# Altium footprint library USER_Lib.PcbLib: 105 footprints (part 6 of 7)
Each footprint in its own frame and in the unit in brackets; x right, y up, seen from the top. Pads: shape width x height; smd on the part's side, far side on the other; paste and mask are expansions set on the pad; w line width, h text height; cw(c..) or ccw(c..) is an arc to the next point about the centre after c.
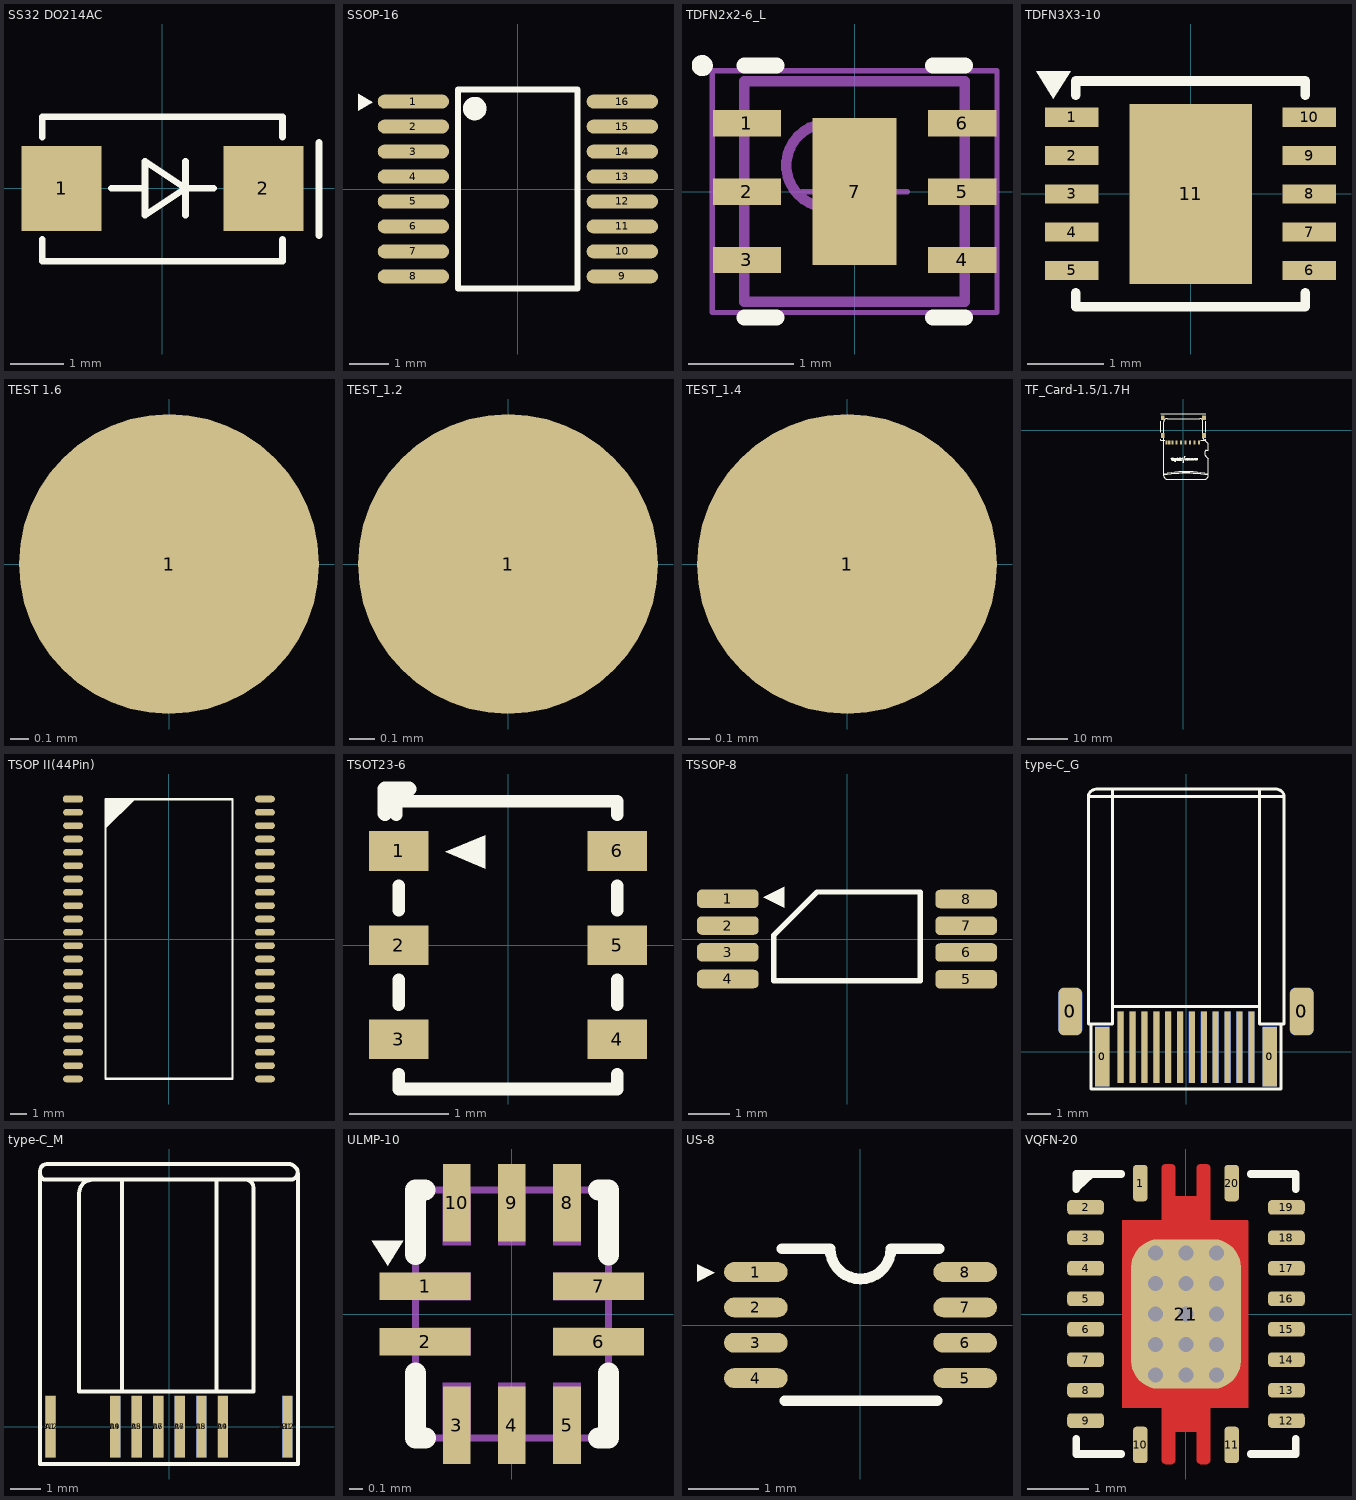
[diagram p5: the footprints below, top view; thin cyan lines are the x and y axes]

## SS32 DO214AC [mm]
pads (2):
  rect 1.5x1.6 smd mask+0.102: 1(-1.9,0) 2(1.9,0)
Top Overlay:
  lines w0.127: -2.261,-0.965 -2.261,-1.372 2.261,-1.372 2.261,-0.965 ; -2.261,0.965 -2.261,1.346 2.261,1.346 2.261,0.965 ; -0.965,0 -0.33,0 ; 0.432,-0.508 0.432,0.508 ; 0.965,0 0.432,0 ; 2.946,-0.889 2.946,0.864 ; 0.432,0 -0.33,0.508 -0.33,-0.508 0.432,0
3D body "SS32 DO214AC.STEP": height 2.2, standoff 0, extent -2.25,-1.35 2.25,1.35

## SSOP-16 [mil]
pads (16):
  oval 71.45x14 smd: 1(-104.52,87.5) 2(-104.52,62.5) 3(-104.52,37.5) 4(-104.52,12.5) 5(-104.52,-12.5) 6(-104.52,-37.5) 7(-104.52,-62.5) 8(-104.52,-87.5) 9(104.52,-87.5) 10(104.52,-62.5) 11(104.52,-37.5) 12(104.52,-12.5) 13(104.52,12.5) 14(104.52,37.5) 15(104.52,62.5) 16(104.52,87.5)
Top Overlay:
  circle w11.81: c-43.18,80.5 r5.91
  region: -160,78.5 -160,95.5 -145,87
  lines w6: -59.8,-99.56 59.8,-99.56 59.8,99.56 -59.8,99.56 -59.8,-99.56

## TDFN2x2-6_L [mm]
height 0.9
pads (7):
  rect 0.65x0.25 smd: 1(-1.025,0.65) 2(-1.025,0) 3(-1.025,-0.65) 4(1.025,-0.65) 5(1.025,0) 6(1.025,0.65)
  rect 0.8x1.4 smd: 7(0,0)
Top Overlay:
  circle w0.1: c-1.45,1.2 r0.05
  lines w0.152: -1.05,-1.2 -0.745,-1.2 ; -1.05,1.2 -0.745,1.2 ; 0.745,-1.2 1.05,-1.2 ; 0.745,1.2 1.05,1.2
Mechanical 13:
  circle w0.1: c-0.25,0.25 r0.4
  lines w0.1: -1.05,-1.05 1.05,-1.05 1.05,1.05 -1.05,1.05 -1.05,-1.05
Mechanical 15:
  circle w0.05: c0,0 r0.35
  lines w0.05: -0.5,0 0.5,0 ; 0,-0.5 0,0.5 ; -1.355,-1.15 1.355,-1.15 1.355,1.15 -1.355,1.15 -1.355,-1.15
3D body "SON65P200X80_HS-7L.step": height 0.8, standoff 0, extent -1.15,-1.05 1.15,1.05

## TDFN3X3-10 [mm]
pads (11):
  rect 0.7x0.25 smd mask+0.102: 1(-1.55,1) 2(-1.55,0.5) 3(-1.55,0) 4(-1.55,-0.5) 5(-1.55,-1) 6(1.55,-1) 7(1.55,-0.5) 8(1.55,0) 9(1.55,0.5) 10(1.55,1)
  rect 1.6x2.35 smd mask+0.102: 11(0,0)
Top Overlay:
  region: -1.791,1.245 -2.019,1.6 -1.562,1.6
  lines w0.127: -1.5,-1.291 -1.5,-1.473 1.5,-1.473 1.5,-1.291 ; -1.5,1.291 -1.5,1.473 1.5,1.473 1.5,1.291
3D body "22222.stp": height 0.72, standoff -0.04, extent -1.51,-1.5 1.51,1.5

## TEST 1.6 [mm]
pads (1):
  round 1.6 smd mask+0.102: 1(0,0)

## TEST_1.2 [mm]
pads (1):
  round 1.2 smd mask+0.102: 1(0,0)

## TEST_1.4 [mm]
pads (1):
  round 1.4 smd mask+0.102: 1(0,0)

## TF_Card-1.5/1.7H [mm] "简易短体9P，带侦测引脚"
pads (13):
  rect 0.5x1 smd: 1(3.85,-3.1) 2(2.75,-3.1) 3(1.65,-3.1) 4(0.55,-3.1) 5(-0.55,-3.1) 6(-1.65,-3.1) 7(-2.75,-3.1) 8(-3.5,-3.1) 9(-4.2,-3.1)
  rect 0.95x1.2 smd: 10(-5.1,-1.35) 10(-5.1,3.1) 10(5.1,-1.35) 10(5.1,3.1)
Top Overlay:
  drawing of 833 lines, arcs and shapes, not listed

## TSOP II(44Pin) [mm]
pads (44):
  oct 1.2x0.4 smd: 1(-5.753,8.4)
  oval 1.2x0.4 smd: 2(-5.753,7.6) 3(-5.753,6.8) 4(-5.753,6) 5(-5.753,5.2) 6(-5.753,4.4) 7(-5.753,3.6) 8(-5.753,2.8) 9(-5.753,2) 10(-5.753,1.2) 11(-5.753,0.4) 12(-5.753,-0.4) 13(-5.753,-1.2) 14(-5.753,-2) 15(-5.753,-2.8) 16(-5.753,-3.6) 17(-5.753,-4.4) 18(-5.753,-5.2) 19(-5.753,-6) 20(-5.753,-6.8) 21(-5.753,-7.6) 22(-5.753,-8.4) 23(5.753,-8.4) 24(5.753,-7.6) 25(5.753,-6.8) 26(5.753,-6) 27(5.753,-5.2) 28(5.753,-4.4) 29(5.753,-3.6) 30(5.753,-2.8) 31(5.753,-2) 32(5.753,-1.2) 33(5.753,-0.4) 34(5.753,0.4) 35(5.753,1.2) 36(5.753,2) 37(5.753,2.8) 38(5.753,3.6) 39(5.753,4.4) 40(5.753,5.2) 41(5.753,6) 42(5.753,6.8) 43(5.753,7.6) 44(5.753,8.4)
Top Overlay:
  region: -3.81,8.382 -2.032,8.382 -3.81,6.604
  lines w0.127: -3.81,-8.382 -3.81,0 -3.81,8.382 3.81,8.382 3.81,0 3.81,-8.382 -3.81,-8.382
3D body "User Library-TSOP2-44.STEP": height 1.3, standoff -0.4, extent -5.867,-9.105 5.893,9.105

## TSOT23-6 [mm]
pads (6):
  rect 0.6x0.4 smd mask+0.102: 1(-1.1,0.95) 2(-1.1,0) 3(-1.1,-0.95) 4(1.1,-0.95) 5(1.1,0) 6(1.1,0.95)
Top Overlay:
  region: -0.635,0.94 -0.229,1.107 -0.229,0.772
  lines w0.127: -1.241,1.575 -1.111,1.575 -1.111,1.445 ; -1.125,1.314 -1.125,1.45 ; -1.1,-1.303 -1.1,-1.45 1.1,-1.45 1.1,-1.303 ; -1.1,-0.603 -1.1,-0.349 ; -1.1,0.351 -1.1,0.597 ; -1.1,1.45 1.1,1.45 1.1,1.314 ; 1.1,-0.603 1.1,-0.349 ; 1.1,0.351 1.1,0.597
  lines w0.152: -1.241,1.328 -1.241,1.575 -0.998,1.575

## TSSOP-8 [mm]
pads (8):
  rrect50% 1.5x0.45 smd mask+0.102: 1(-2.896,0.978) 2(-2.896,0.328) 3(-2.896,-0.322) 4(-2.896,-0.972) 5(2.896,-0.978) 6(2.896,-0.328) 7(2.896,0.322) 8(2.896,0.972)
Top Overlay:
  region: -2.032,1.016 -1.524,0.762 -1.524,1.27
  lines w0.127: -1.778,-1.016 1.778,-1.016 1.778,1.143 0,1.143 -0.729,1.143 -1.778,0.094 -1.778,-1.016

## type-C_G [mm] "type-C公头         夹板24P"
pads (32):
  rrect50% 1x2 smd: 0(-4.877,1.702) 0(4.877,1.702)
  rrect50% 1x2 smd far side: 0(-4.877,1.702) 0(4.877,1.702)
  rect 0.6x2.5 smd: 0(-3.525,-0.2) 0(3.525,-0.2)
  rect 0.6x2.5 smd far side: 0(-3.525,-0.2) 0(3.525,-0.2)
  rect 0.25x3 smd: A1(-2.75,0.2) A2(-2.25,0.2) A3(-1.75,0.2) A4(-1.25,0.2) A5(-0.75,0.2) A6(-0.25,0.2) A7(0.25,0.2) A8(0.75,0.2) A9(1.25,0.2) A10(1.75,0.2) A11(2.25,0.2) A12(2.75,0.2)
  rect 0.25x3 smd far side: B1(2.75,0.2) B2(2.25,0.2) B3(1.75,0.2) B4(1.25,0.2) B5(0.75,0.2) B6(0.25,0.2) B7(-0.25,0.2) B8(-0.75,0.2) B9(-1.25,0.2) B10(-1.75,0.2) B11(-2.25,0.2) B12(-2.75,0.2)
Top Overlay:
  lines w0.127: -3.8,11.068 3.785,11.068 cw(c3.785,10.718) 4.135,10.718 4.135,1.168 4,1.168 ; -3.8,11.07 ccw(c-3.759,10.713) -4.115,10.763 ; -3.087,11.069 cw(c-3.087,11.069) -3.087,11.069 -3.087,10.573 -3.087,1.905 ; 3.983,1.168 4,1.168 ; 4.132,10.764 cw(c4.131,10.764) 4.131,10.763 -4.115,10.763 ; -4.115,10.763 -4.115,1.168 -3.987,1.168 ; -3.987,1.168 -4,1.168 -4,1.092 -4,-1.562 0,-1.562 4,-1.562 4,1.092 4,1.168 ; -3.987,1.168 -3.771,1.168 -3.087,1.168 -3.087,1.905 ; -3.087,1.905 0,1.905 3.087,1.905 ; 3.087,1.905 3.087,1.168 3.771,1.168 3.987,1.168 4,1.168 ; 3.087,1.905 3.087,10.623 3.087,11.063 ; 3.087,11.063 ccw(c3.086,11.063) 3.086,11.064
Bottom Overlay:
  lines w0.076: -3.8,11.068 3.785,11.068 cw(c3.785,10.718) 4.135,10.718 4.135,1.168 4,1.168 ; -3.8,11.07 ccw(c-3.759,10.713) -4.115,10.763 ; -3.087,11.069 cw(c-3.087,11.069) -3.087,11.069 -3.087,10.573 -3.087,1.905 ; 3.983,1.168 4,1.168 ; 4.132,10.764 cw(c4.131,10.764) 4.131,10.763 -4.115,10.763 ; -4.115,10.763 -4.115,1.168 -3.987,1.168 ; -3.987,1.168 -4,1.168 -4,1.092 -4,-1.562 0,-1.562 4,-1.562 4,1.092 4,1.168 ; -3.987,1.168 -3.771,1.168 -3.087,1.168 -3.087,1.905 ; -3.087,1.905 0,1.905 3.087,1.905 ; 3.087,1.905 3.087,1.168 3.771,1.168 3.987,1.168 4,1.168 ; 3.087,1.905 3.087,10.623 3.087,11.063 ; 3.087,11.063 ccw(c3.086,11.063) 3.086,11.064

## type-C_M [mm] "type-C母头       夹板16P"
pads (16):
  rect 0.33x2 smd mask+0.102: A1(-3.848,0) A4(-1.748,0) A5(-1.048,0) A6(-0.348,0) A7(0.352,0) A8(1.052,0) A9(1.752,0) A12(3.852,0)
  rect 0.33x2 smd far side mask+0.102: B1(3.848,0) B4(1.748,0) B5(1.048,0) B6(0.348,0) B7(-0.352,0) B8(-1.052,0) B9(-1.752,0) B12(-3.852,0)
Top Overlay:
  lines w0.127: -4.192,8.216 ccw(c-4.003,8.216) -4.003,8.026 -2.489,8.026 ; -1.524,1.143 -1.524,8.026 ; 1.549,1.143 1.549,8.026 ; 4.186,8.266 cw(c3.946,8.266) 3.946,8.026 2.489,8.026 ; -2.489,8.026 ccw(c-2.489,7.595) -2.921,7.595 -2.921,1.143 2.743,1.143 2.743,7.772 ccw(c2.489,7.772) 2.489,8.026 ; -2.489,8.026 2.489,8.026 ; -4.191,-1.219 -4.191,7.188 -4.191,8.316 cw(c-3.975,8.316) -3.975,8.532 3.884,8.532 ccw(c3.884,8.534) 3.886,8.534 cw(c3.886,8.23) 4.191,8.23 4.191,-1.219 0,-1.219 -4.191,-1.219

## ULMP-10 [mm]
pads (10):
  rect 0.663x0.201 smd mask+0.051: 1(-0.63,0.201) 2(-0.63,-0.201) 6(0.63,-0.201) 7(0.63,0.201)
  rect 0.201x0.564 smd mask+0.051: 3(-0.399,-0.808) 4(0,-0.808) 5(0.401,-0.808) 8(0.401,0.808) 9(0,0.808) 10(-0.399,0.808)
Top Overlay:
  region: -0.788,0.533 -0.902,0.351 -1.016,0.533
  lines w0.152: -0.701,-0.429 -0.701,-0.899 -0.627,-0.899 ; -0.701,0.434 -0.701,0.899 -0.631,0.899 ; 0.63,-0.899 0.701,-0.899 0.701,-0.428 ; 0.631,0.899 0.701,0.899 0.701,0.43
Mechanical 15:
  region: 0.099,0.899 0.099,0.5 -0.099,0.5 -0.099,0.899
  region: -0.3,0.899 -0.3,0.5 -0.5,0.5 -0.5,0.899
  region: 0.5,0.899 0.5,0.5 0.3,0.5 0.3,0.899
  region: -0.3,-0.5 -0.3,-0.899 -0.5,-0.899 -0.5,-0.5
  region: 0.099,-0.5 0.099,-0.899 -0.099,-0.899 -0.099,-0.5
  region: 0.5,-0.5 0.5,-0.899 0.3,-0.899 0.3,-0.5
  region: 0.701,0.3 0.3,0.3 0.3,0.099 0.701,0.099
  region: 0.701,-0.099 0.3,-0.099 0.3,-0.3 0.701,-0.3
  region: -0.701,-0.099 -0.3,-0.099 -0.3,-0.3 -0.701,-0.3
  region: -0.701,0.3 -0.3,0.3 -0.3,0.099 -0.701,0.099
  region: -0.701,0.838 -0.676,0.838 -0.64,0.874 -0.64,0.924 -0.676,0.96 -0.701,0.96 -0.726,0.96 -0.762,0.924 -0.762,0.874 -0.726,0.838
  lines w0.051: -0.701,-0.899 -0.701,0.899 0.701,0.899 0.701,-0.899 -0.701,-0.899
3D body "UMLP-10.STEP": height 0.51, standoff 0, extent -0.711,-0.905 0.708,0.915

## US-8 [mm]
pads (8):
  oval 0.9x0.28 smd: 1(-1.48,0.75) 2(-1.48,0.25) 3(-1.48,-0.25) 4(-1.48,-0.75) 5(1.48,-0.75) 6(1.48,-0.25) 7(1.48,0.25) 8(1.48,0.75)
Top Overlay:
  region: -2.311,0.864 -2.057,0.737 -2.311,0.61
  lines w0.152: -1.11,1.08 -0.43,1.08 ccw(c0,1.083) 0.431,1.08 ; -1.07,-1.07 1.08,-1.07 ; 0.43,1.08 1.11,1.08

## VQFN-20 [mm]
pads (21):
  rrect50% 0.24x0.6 smd: 1(-0.75,2.15) 10(-0.75,-2.15) 11(0.75,-2.15) 20(0.75,2.15)
  rrect50% 0.6x0.24 smd: 2(-1.65,1.75) 3(-1.65,1.25) 4(-1.65,0.75) 5(-1.65,0.25) 6(-1.65,-0.25) 7(-1.65,-0.75) 8(-1.65,-1.25) 9(-1.65,-1.75) 12(1.65,-1.75) 13(1.65,-1.25) 14(1.65,-0.75) 15(1.65,-0.25) 16(1.65,0.25) 17(1.65,0.75) 18(1.65,1.25) 19(1.65,1.75)
  rrect50% 1.8x2.45 smd: 21(0,0)
via -0.5,1 diameter 0.45 hole 0.25
via 0,1 diameter 0.45 hole 0.25
via 0.5,1 diameter 0.45 hole 0.25
via 0.5,0.5 diameter 0.45 hole 0.25
via 0,0.5 diameter 0.45 hole 0.25
via -0.5,0.5 diameter 0.45 hole 0.25
via -0.5,0 diameter 0.45 hole 0.25
via 0,0 diameter 0.45 hole 0.25
via 0.5,0 diameter 0.45 hole 0.25
via 0.5,-0.5 diameter 0.45 hole 0.25
via 0,-0.5 diameter 0.45 hole 0.25
via -0.5,-0.5 diameter 0.45 hole 0.25
via -0.5,-1 diameter 0.45 hole 0.25
via 0,-1 diameter 0.45 hole 0.25
via 0.5,-1 diameter 0.45 hole 0.25
Top Layer:
  region: -1.038,-1.538 -0.401,-1.538 -0.401,-2.403 -0.401,-2.415 -0.391,-2.437 -0.375,-2.454 -0.353,-2.463 -0.341,-2.463 -0.234,-2.463 -0.222,-2.463 -0.2,-2.454 -0.184,-2.437 -0.174,-2.415 -0.174,-2.403 -0.174,-1.937 0.174,-1.937 0.174,-2.403 0.174,-2.415 0.184,-2.437 0.2,-2.454 0.222,-2.463 0.234,-2.463 0.341,-2.463 0.353,-2.463 0.375,-2.454 0.391,-2.437 0.401,-2.415 0.401,-2.403 0.401,-1.538 1.012,-1.538 1.015,-1.538 1.02,-1.536 1.024,-1.532 1.026,-1.528 1.026,-1.525 1.026,1.519 1.025,1.522 1.021,1.528 1.016,1.533 1.01,1.536 1.007,1.537 0.401,1.537 0.401,2.403 0.401,2.415 0.391,2.437 0.375,2.454 0.353,2.463 0.341,2.463 0.234,2.463 0.222,2.463 0.2,2.454 0.184,2.437 0.174,2.415 0.174,2.403 0.174,1.937 -0.174,1.937 -0.174,2.403 -0.174,2.415 -0.184,2.437 -0.2,2.454 -0.222,2.463 -0.234,2.463 -0.341,2.463 -0.353,2.463 -0.375,2.454 -0.391,2.437 -0.401,2.415 -0.401,2.403 -0.401,1.538 -1.038,1.538 -1.04,1.538 -1.045,1.536 -1.049,1.532 -1.051,1.528 -1.051,1.525 -1.051,-1.525 -1.051,-1.528 -1.049,-1.532 -1.045,-1.536 -1.04,-1.538
Top Overlay:
  lines w0.127: -1.801,-2.048 -1.801,-2.301 -1.062,-2.301 ; -1.801,2.048 -1.801,2.301 -1.062,2.301 ; -1.792,2.157 -1.646,2.283 ; -1.788,2.081 -1.56,2.297 ; 1.062,-2.301 1.801,-2.301 1.801,-2.048 ; 1.062,2.301 1.801,2.301 1.801,2.048
Top Solder:
  region: -1.038,-1.538 -0.401,-1.538 -0.401,-2.403 -0.401,-2.415 -0.391,-2.437 -0.375,-2.454 -0.353,-2.463 -0.341,-2.463 -0.234,-2.463 -0.222,-2.463 -0.2,-2.454 -0.184,-2.437 -0.174,-2.415 -0.174,-2.403 -0.174,-1.937 0.174,-1.937 0.174,-2.403 0.174,-2.415 0.184,-2.437 0.2,-2.454 0.222,-2.463 0.234,-2.463 0.341,-2.463 0.353,-2.463 0.375,-2.454 0.391,-2.437 0.401,-2.415 0.401,-2.403 0.401,-1.538 1.012,-1.538 1.015,-1.538 1.02,-1.536 1.024,-1.532 1.026,-1.528 1.026,-1.525 1.026,1.519 1.025,1.522 1.021,1.528 1.016,1.533 1.01,1.536 1.007,1.537 0.401,1.537 0.401,2.403 0.401,2.415 0.391,2.437 0.375,2.454 0.353,2.463 0.341,2.463 0.234,2.463 0.222,2.463 0.2,2.454 0.184,2.437 0.174,2.415 0.174,2.403 0.174,1.937 -0.174,1.937 -0.174,2.403 -0.174,2.415 -0.184,2.437 -0.2,2.454 -0.222,2.463 -0.234,2.463 -0.341,2.463 -0.353,2.463 -0.375,2.454 -0.391,2.437 -0.401,2.415 -0.401,2.403 -0.401,1.538 -1.038,1.538 -1.04,1.538 -1.045,1.536 -1.049,1.532 -1.051,1.528 -1.051,1.525 -1.051,-1.525 -1.051,-1.528 -1.049,-1.532 -1.045,-1.536 -1.04,-1.538
3D body "VQFN-20.STEP": height 1, standoff 0, extent -1.8,-2.3 1.8,2.3